# Altium footprint library ZabugorLib.PcbLib: 89 footprints (part 5 of 6)
Each footprint in its own frame and in the unit in brackets; x right, y up, seen from the top. Pads: shape width x height; smd on the part's side, far side on the other; paste and mask are expansions set on the pad; w line width, h text height; cw(c..) or ccw(c..) is an arc to the next point about the centre after c.
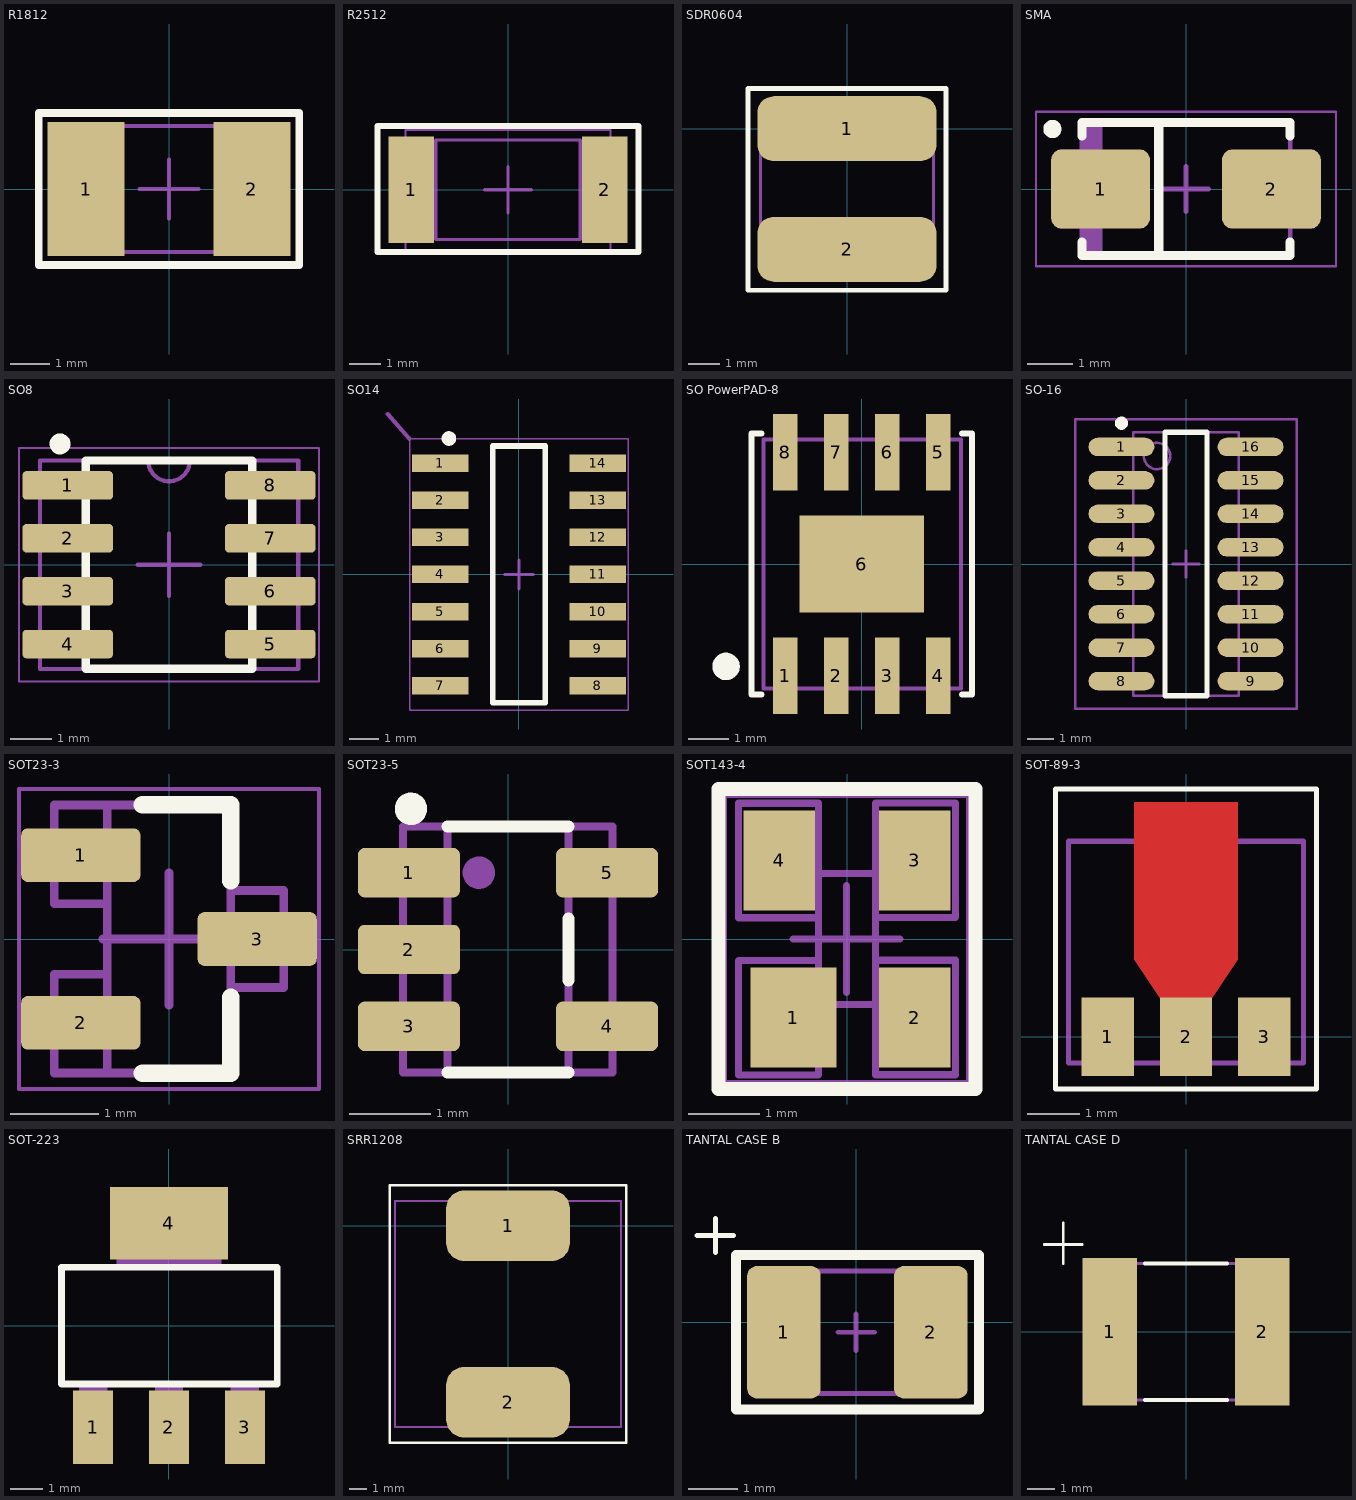
[diagram p4: the footprints below, top view; thin cyan lines are the x and y axes]

## R1812 [mm]
pads (2):
  rect 1.95x3.4 smd: 1(-2.1,0) 2(2.1,0)
Top Overlay:
  lines w0.2: -3.3,-1.925 -3.3,1.925 3.3,1.925 3.3,-1.925 -3.3,-1.925
Mechanical 9:
  text ".Designator" at -1.25,0.25 h1
  text ".Comment" at -1.25,-0.5 h0.8
Mechanical 11:
  lines w0.1: -2.325,-1.6 2.325,-1.6 2.325,1.6 -2.325,1.6 -2.325,-1.6
Mechanical 15:
  lines w0.05: -3.3,-1.925 3.3,-1.925 3.3,1.925 -3.3,1.925 -3.3,-1.925
  lines w0.1: -0.75,0 0.75,0 ; 0,-0.75 0,0.75
3D body "User Library-1812(4532M) Res.step": height 2.54, standoff 0, extent -2.81,-1.6 2.81,1.6

## R2512 [mm]
pads (2):
  rect 1.45x3.43 smd: 1(-3.115,0) 2(3.115,0)
Top Overlay:
  lines w0.2: -4.2,-2 4.2,-2 4.2,2.05 -4.2,2.05 -4.2,-2
Mechanical 9:
  text ".Comment" at -1.25,-0.5 h0.8
  text ".Designator" at -1.25,0.25 h1
Mechanical 11:
  lines w0.1: -2.325,-1.6 -2.325,1.6 2.325,1.6 2.325,-1.6 -2.325,-1.6
Mechanical 15:
  lines w0.05: -3.3,-1.925 -3.3,1.925 3.3,1.925 3.3,-1.925 -3.3,-1.925
  lines w0.1: -0.75,0 0.75,0 ; 0,-0.75 0,0.75
3D body "User Library-R2512-1.step": height 0.55, standoff 0, extent -3.35,-1.6 3.35,1.6

## SDR0604 [mm] "SMD Power Inductors"
pads (2):
  rrect50% 5.8x2.1 smd: 1(0,0) 2(0,-3.9)
Top Overlay:
  lines w0.15: -3.2,-5.225 3.2,-5.225 3.2,-5 3.2,1.3 -3.2,1.3 -3.2,-5.225
Mechanical 7:
  lines w0.1: -2.8,-4.2 -2.8,0.5 2.8,0.5 2.8,-4.2 -2.8,-4.2
3D body "User Library-SDR0604.step": height 4.55, standoff 0, extent -2.8,-4.704 2.8,0.804

## SMA [mm]
height 2.67
pads (2):
  rrect25% 2.17x1.74 smd: 1(-1.88,0) 2(1.88,0)
Top Overlay:
  circle w0.2: c-2.94,1.32 r0.1
  lines w0.2: -2.29,-1.17 -2.29,-1.46 2.29,-1.46 2.29,-1.17 ; -2.29,1.17 -2.29,1.46 2.29,1.46 2.29,1.17 ; -0.6,-1.45 -0.6,1.45
Mechanical 9:
  text ".Comment" at -0.75,-0.5 h0.8
  text ".Designator" at -0.75,0.25 h1
Mechanical 11:
  lines w0.1: -2.29,-0.82 -2.8,-0.82 -2.8,0.82 -2.29,0.82 ; -2.19,-1.44 -2.19,1.46 ; -2.09,-1.44 -2.09,1.46 ; -1.99,-1.44 -1.99,1.46 ; -1.89,-1.44 -1.89,1.46 ; 2.29,-0.82 2.8,-0.82 2.8,0.82 2.29,0.82 ; -2.29,-1.46 -2.29,1.46 2.29,1.46 2.29,-1.46 -2.29,-1.46
Mechanical 15:
  lines w0.05: -3.3,-1.7 3.3,-1.7 3.3,1.7 -3.3,1.7 -3.3,-1.7
  lines w0.1: -0.5,0 0.5,0 ; 0,-0.5 0,0.5
3D body "User Library-DO-214AC_SMA.step": height 2.15, standoff -0.05, extent -2.5,-1.35 2.5,1.35

## SO8 [mm]
height 1.75
pads (8):
  rrect25% 2.17x0.68 smd: 1(-2.43,1.905) 2(-2.43,0.635) 3(-2.43,-0.635) 4(-2.43,-1.905) 5(2.43,-1.905) 6(2.43,-0.635) 7(2.43,0.635) 8(2.43,1.905)
Top Overlay:
  circle w0.25: c-2.615,2.9 r0.125
  lines w0.2: -2,-2.5 2,-2.5 2,2.5 -2,2.5 ; -2,-2.475 -2,2.475
Mechanical 9:
  text ".Designator" at -0.75,0.25 h1
  text ".Comment" at -0.75,-0.5 h0.8
Mechanical 11:
  lines w0.1: -2,-2.5 -2,2.5 ; -0.5,2.5 ccw(c0,2.5) 0.5,2.5 ; 2,-2.5 2,2.5 ; -3.1,-2.5 -3.1,2.5 3.1,2.5 3.1,-2.5 -3.1,-2.5
Mechanical 15:
  lines w0.05: -3.6,-2.8 3.6,-2.8 3.6,2.8 -3.6,2.8 -3.6,-2.8
  lines w0.1: -0.75,0 0.75,0 ; 0,-0.75 0,0.75
3D body "SOIC-8.STEP": height 1.7, standoff 0, extent -3,-2.54 3,2.54

## SO14 [mm] "SOIC, 14-Leads, Body 8,65x3,90mm, Pitch 1,27mm, IPC Medium Density"
height 1.75
pads (14):
  rect 1.946x0.6 smd: 1(-2.7,3.81) 2(-2.7,2.54) 3(-2.7,1.27) 4(-2.7,0) 5(-2.7,-1.27) 6(-2.7,-2.54) 7(-2.7,-3.81) 8(2.7,-3.81) 9(2.7,-2.54) 10(2.7,-1.27) 11(2.7,0) 12(2.7,1.27) 13(2.7,2.54) 14(2.7,3.81)
Top Overlay:
  circle w0.25: c-2.4,4.66 r0.125
  lines w0.2: -0.9,-4.4 -0.9,4.4 0.9,4.4 0.9,-4.4 -0.9,-4.4
Mechanical 9:
  text ".Designator" at -2.225,5.725 h0.8
  text ".Comment" at -1.75,5.05 h0.6
Mechanical 11:
  lines w0.05: -3.75,-4.65 -3.75,4.65 3.75,4.65 3.75,-4.65 -3.75,-4.65
  lines w0.1: -0.5,0 0.5,0 ; 0,-0.5 0,0.5
  lines w0.15: -4.5,5.5 -3.75,4.65
3D body "User Library-SOIC14-150.step": height 1.75, standoff 0, extent -2.9,-4.275 2.9,4.275

## SO PowerPAD-8 [mm]
pads (9):
  rect 0.61x1.91 smd: 1(-1.905,-2.78) 2(-0.635,-2.78) 3(0.635,-2.78) 4(1.905,-2.78) 5(1.905,2.78) 6(0.635,2.78) 7(-0.635,2.78) 8(-1.905,2.78)
  rect 3.1x2.41 smd: 6(0,0)
Top Overlay:
  circle w0.254: c-3.377,-2.55 r0.215
  circle w0.254: c-3.402,-2.55 r0.127
  lines w0.15: -2.5,-3.25 -2.75,-3.25 -2.75,3.25 -2.5,3.25 ; 2.5,-3.25 2.75,-3.25 2.75,3.25 2.5,3.25
Mechanical 7:
  lines w0.1: -2.45,-3.1 -2.45,3.1 2.475,3.1 2.475,-3.1 -2.45,-3.1
3D body "CircuitWorks-SO-8.step": height 1.45, standoff 0, extent -2.451,-2.925 2.451,2.853

## SO-16 [mm] "16-Pin Small Outline Integrated Circuit 1.27 mm Pitch, IPC Low Density"
height 1.75
pads (16):
  oval 2.5x0.7 smd: 1(-2.45,4.445) 2(-2.45,3.175) 3(-2.45,1.905) 4(-2.45,0.635) 5(-2.45,-0.635) 6(-2.45,-1.905) 7(-2.45,-3.175) 8(-2.45,-4.445) 9(2.45,-4.445) 10(2.45,-3.175) 11(2.45,-1.905) 12(2.45,-0.635) 13(2.45,0.635) 14(2.45,1.905) 15(2.45,3.175) 16(2.45,4.445)
Top Overlay:
  circle w0.25: c-2.45,5.345 r0.125
  lines w0.2: -0.8,-5 -0.8,5 0.8,5 0.8,-5 -0.8,-5
Mechanical 13:
  circle w0.1: c-1.1,4.1 r0.5
  lines w0.1: -2,-5 -2,5 2,5 2,-5 -2,-5
Mechanical 15:
  lines w0.1: -0.5,0 0.5,0 ; 0,-0.5 0,0.5 ; -4.2,-5.5 -4.2,5.5 4.2,5.5 4.2,-5.5 -4.2,-5.5
3D body "so16-1 (SOT109-1).STEP": height 1.78, standoff 0.01, extent -3.068,-4.985 3.068,4.985

## SOT23-3 [mm]
height 1.12
pads (3):
  rrect25% 1.35x0.61 smd: 1(-1,0.95) 2(-1,-0.95) 3(1,0)
Top Overlay:
  lines w0.2: -0.3,-1.52 0.7,-1.52 0.7,-0.66 ; -0.3,1.52 0.7,1.52 0.7,0.66
Mechanical 9:
  text ".Designator" at -0.75,0.25 h1
  text ".Comment" at -0.75,-0.5 h0.8
Mechanical 11:
  lines w0.1: -0.7,-1.52 -0.7,1.52 ; -0.7,-0.4 -1.3,-0.4 -1.3,-1.52 0.7,-1.52 0.7,1.52 -1.3,1.52 -1.3,0.4 -0.7,0.4 ; 0.7,-0.55 1.3,-0.55 1.3,0.55 0.7,0.55
Mechanical 15:
  lines w0.05: -1.7,-1.7 1.7,-1.7 1.7,1.7 -1.7,1.7 -1.7,-1.7
  lines w0.1: -0.75,0 0.75,0 ; 0,-0.75 0,0.75
3D body "SOT-23-3.STEP": height 1.1, standoff 0, extent -1.15,-1.5 1.15,1.5

## SOT23-5 [mm]
height 1.12
pads (5):
  rrect25% 1.26x0.61 smd: 1(-1.225,0.95) 2(-1.225,0) 3(-1.225,-0.95) 4(1.225,-0.95) 5(1.225,0.95)
Top Overlay:
  circle w0.2: c-1.2,1.74 r0.1
  lines w0.15: -0.75,-1.52 0.75,-1.52 ; -0.75,1.52 0.75,1.52 ; 0.75,-0.38 0.75,0.38
Mechanical 7:
  circle w0.2: c-0.36,0.95 r0.1
  lines w0.1: -0.75,-1.52 -0.75,1.52 ; 0.75,-1.52 0.75,1.52 ; -1.3,-1.52 -1.3,1.52 1.29,1.52 1.29,-1.52 -1.3,-1.52
Mechanical 10:
  text ".Comment" at -0.95,-2.13 h0.6
  text ".Designator" at -0.73,1.79 h0.8
3D body "User Library-SOT23-5-3.STEP": height 1.45, standoff 0.01, extent -1.6,-1.555 1.6,1.545

## SOT143-4 [mm]
height 1.12
pads (4):
  rect 1.2x1.4 smd: 1(-0.75,-1.1)
  rect 1x1.4 smd: 2(0.95,-1.1) 3(0.95,1.1) 4(-0.95,1.1)
Top Overlay:
  lines w0.2: -1.8,-2.1 1.8,-2.1 1.8,2.1 -1.8,2.1 -1.8,-2.1
Mechanical 9:
  text ".Comment" at 11.049,-3.175 h0.8
  text ".Designator" at 10.287,-3.937 h1
Mechanical 11:
  lines w0.1: -0.4,-0.917 0.4,-0.917 ; -0.4,-0.9 -0.4,1.9 -1.518,1.9 -1.518,0.297 -0.4,0.297 ; -0.4,0.917 0.4,0.917 ; 0.4,0.3 1.518,0.3 1.518,1.903 0.4,1.903 ; 0.4,1.9 0.4,-0.297 ; 0.4,-0.297 0.4,-1.9 1.518,-1.9 1.518,-0.297 0.4,-0.297 ; -1.518,-1.903 -0.4,-1.903 -0.4,-0.3 -1.518,-0.3 -1.518,-1.903
Mechanical 15:
  lines w0.05: -1.706,-2 -1.706,2 1.694,2 1.694,-2 -1.706,-2
  lines w0.1: -0.756,0 0.744,0 ; -0.006,-0.75 -0.006,0.75
3D body "User Library-sot143.step": height 1, standoff 0, extent -1.46,-1.21 1.46,1.21

## SOT-89-3 [mm]
pads (3):
  rect 1x1.5 smd: 1(-1.5,0) 2(0,0) 3(1.5,0)
Top Layer:
  rectangle: -1,1.5 1,4.5
  region: -1,1.5 -0.5,0.75 0.5,0.75 1,1.5
Top Overlay:
  lines w0.1: -2.5,-1 2.5,-1 2.5,4.75 -2.5,4.75 -2.5,-1
Mechanical 15:
  lines w0.1: -2.25,-0.5 -2.25,3.75 2.25,3.75 2.25,-0.5 -2.25,-0.5
3D body "User Library-SOT89-3.STEP": height 1.54, standoff 0, extent -2.25,-0.5 2.25,3.75

## SOT-223 [mil]
pads (4):
  rect 48x88 smd: 1(-90.98,-122.01) 2(0,-122.01) 3(91,-122.01)
  rect 142x87 smd: 4(0,123)
Top Overlay:
  lines w8: -129.02,-70 -129.02,70 130,70 130,-70 -129.02,-70
Mechanical 16:
  rectangle: 74,-144 108,-71
  rectangle: -108,-144 -74,-71
  rectangle: -17,-144 17,-71
  rectangle: -63,71 63,144
  rectangle: 74,-144 108,-71
  rectangle: -108,-144 -74,-71
  rectangle: -17,-144 17,-71
  rectangle: -63,71 63,144

## SRR1208 [mm] "SMD Power Inductors"
pads (2):
  rrect50% 7x4 smd: 1(0,0) 2(0,-10)
Top Overlay:
  lines w0.15: -6.7,-12.3 6.7,-12.3 6.7,-7.3 6.7,2.3 -6.7,2.3 -6.7,-12.3
Mechanical 7:
  lines w0.1: -6.4,-11.4 -6.4,1.4 6.4,1.4 6.4,-11.4 -6.4,-11.4
3D body "User Library-SRR1208.step": height 8.5, standoff 0.01, extent -6.35,-11.35 6.35,1.35

## TANTAL CASE B [mm] "Конденсатор электролитический танталовый"
height 2.5
pads (2):
  rrect25% 1.5x2.7 smd: 1(-1.475,-0.2) 2(1.525,-0.2)
Top Overlay:
  lines w0.1: -3.25,1.775 -2.5,1.775 ; -2.875,1.425 -2.875,2.125
  lines w0.2: -2.455,-1.78 2.505,-1.78 2.505,1.38 -2.455,1.38 -2.455,-1.78
Mechanical 9:
  text ".Designator" at -1.25,0 h1
  text ".Comment" at -1.25,-0.75 h0.8
Mechanical 11:
  lines w0.1: -1.575,-1.45 -1.575,1.05 1.625,1.05 1.625,-1.45 -1.575,-1.45
Mechanical 15:
  lines w0.05: -2.455,-1.78 -2.455,1.38 2.505,1.38 2.505,-1.78 -2.455,-1.78
  lines w0.1: -0.375,-0.2 0.375,-0.2 ; 0,-0.575 0,0.175
3D body "User Library-CaseB_3528-21.step": height 1.9, standoff 0, extent -1.7,-1.6 1.8,1.2

## TANTAL CASE D [mm] "Конденсатор танталовый SMD"
height 1.8
pads (2):
  rect 2x5.4 smd: 1(-2.8,0) 2(2.8,0)
Top Overlay:
  lines w0.1: -5.2,3.2 -3.8,3.2 ; -4.5,2.5 -4.5,4
  lines w0.15: -1.5,-2.5 1.5,-2.5 ; -1.5,2.5 1.5,2.5
Mechanical 7:
  lines w0.1: -2.8,-2.5 -2.8,2.5 2.8,2.5 2.8,-2.5 -2.8,-2.5
Mechanical 10:
  text ".Designator" at -0.56,3.04 h0.8
  text ".Comment" at -0.47,-3.45 h0.6
3D body "User Library-CAP_TANT_7343-40.step": height 4, standoff 0, extent -3.8,-2.3 3.8,2.3